# Altium footprint library RFID_RC632.PcbLib: 23 footprints (part 1 of 2)
Each footprint in its own frame and in the unit in brackets; x right, y up, seen from the top. Pads: shape width x height; smd on the part's side, far side on the other; paste and mask are expansions set on the pad; w line width, h text height; cw(c..) or ccw(c..) is an arc to the next point about the centre after c.
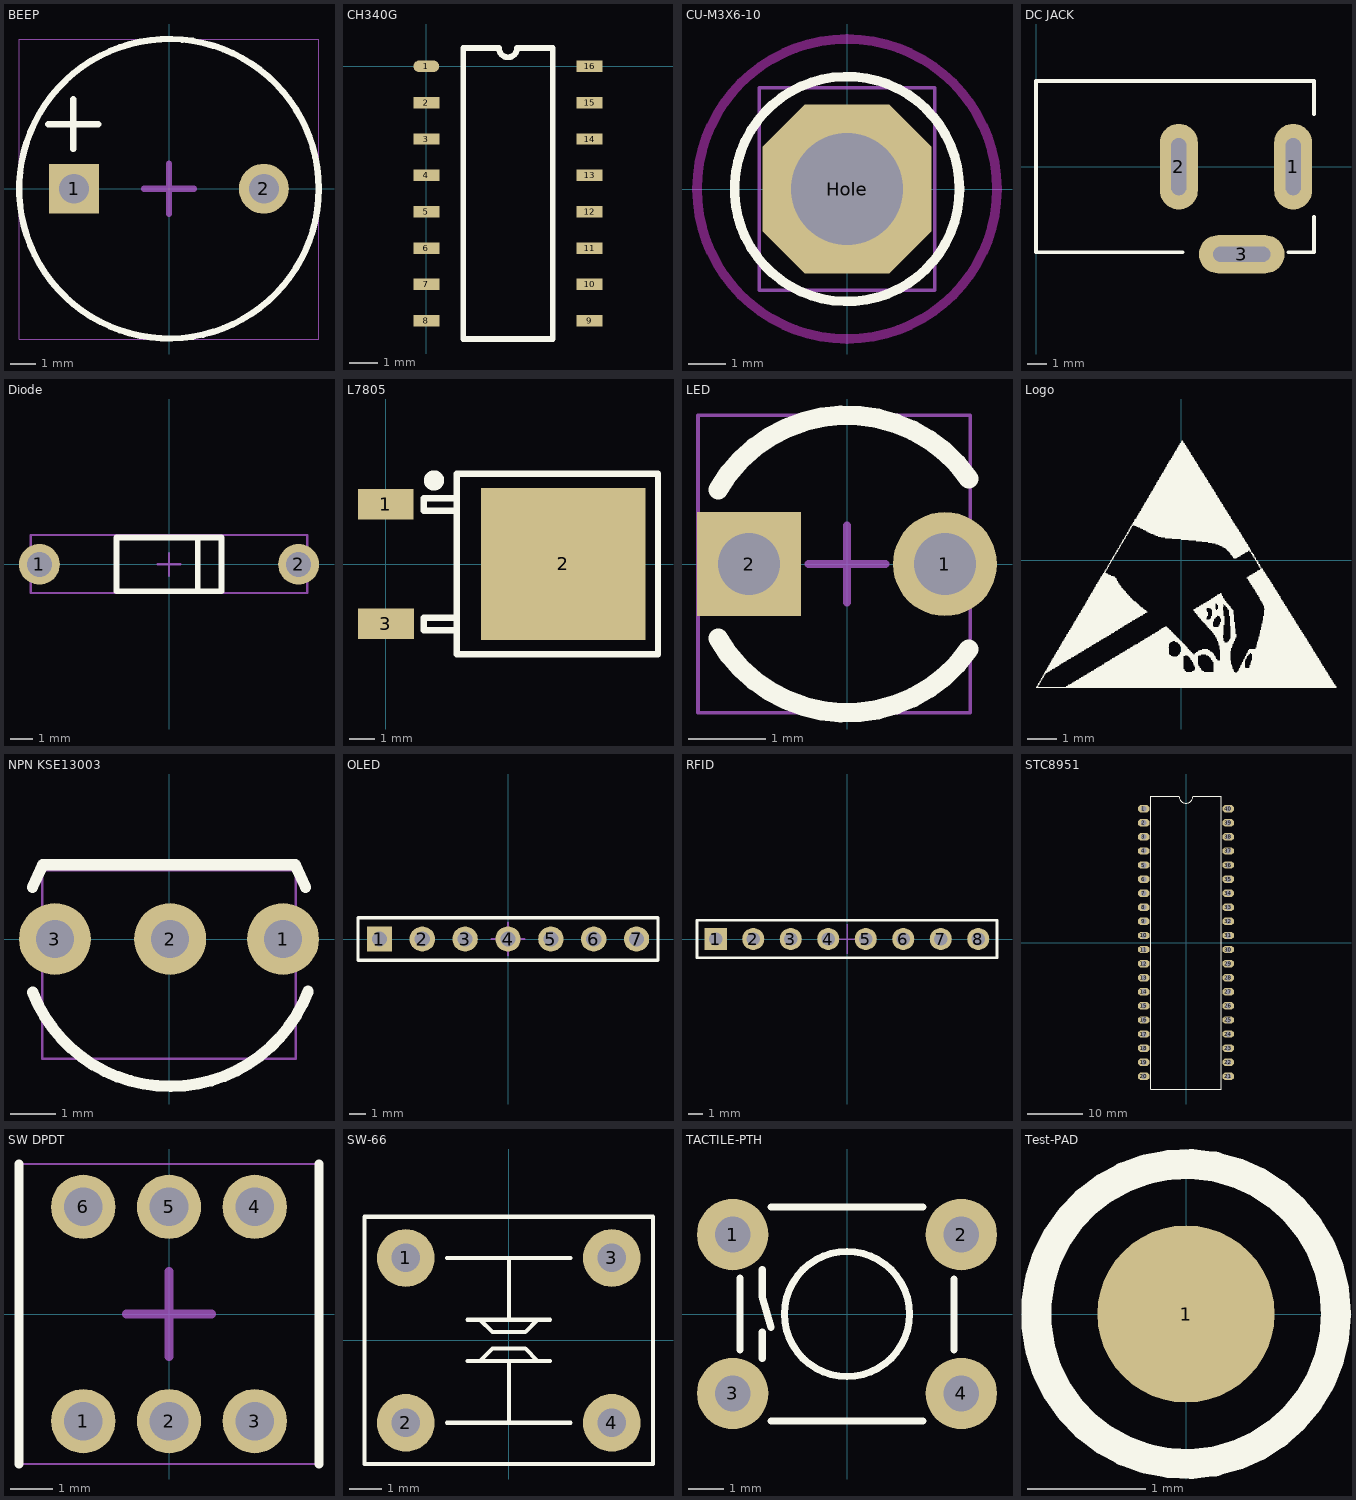
[diagram p0: the footprints below, top view; thin cyan lines are the x and y axes]

## BEEP [mm] "7.62脚距，12x9.5蜂鸣器"
height 9.5
pads (2):
  rect 2x2 hole 1.2: 1(-3.8,0)
  round 2 hole 1.2: 2(3.8,0)
Top Overlay:
  circle w0.254: c0,0 r6
  lines w0.254: -4.835,2.591 -2.835,2.591 ; -3.835,1.591 -3.835,3.591
Mechanical 13:
  lines w0.05: -6,-6.02 -6,5.98 6,5.98 6,-6.02 -6,-6.02
Mechanical 15:
  lines w0.254: -1,0 1,0 ; 0,-1 0,1
3D body "beep-d12000x9600.stp": height 9.8, standoff -4, extent -6,-6.02 6,5.98

## CH340G [mm] "USB to TTL Serial / UART"
pads (16):
  oval 0.9x0.4 smd: 1(0,0)
  rect 0.9x0.4 smd: 2(0,-1.27) 3(0,-2.54) 4(0,-3.81) 5(0,-5.08) 6(0,-6.35) 7(0,-7.62) 8(0,-8.89) 9(5.7,-8.89) 10(5.7,-7.62) 11(5.7,-6.35) 12(5.7,-5.08) 13(5.7,-3.81) 14(5.7,-2.54) 15(5.7,-1.27) 16(5.7,0)
Top Overlay:
  lines w0.2: 1.285,-9.525 4.415,-9.525 4.415,0.635 3.167,0.635 cw(c2.85,0.635) 2.532,0.635 1.285,0.635 1.285,-9.525
3D body "SOP-16.STEP": height 1.55, standoff -0.05, extent -0.282,-9.445 5.982,0.555

## CU-M3X6-10 [mm] "10mm长M3六角铜柱"
height 10
pads (1):
  oct 4.5x4.5 hole 3: Hole(0,0)
Top Overlay:
  circle w0.254: c0,0 r3
Keep-Out Layer:
  circle w0.254: c0,0 r4
Mechanical 1:
  circle w0.15: c0,0 r1.5
Mechanical 13:
  lines w0.1: -2.34,-2.702 -2.34,2.702 2.34,2.702 2.34,-2.702 -2.34,-2.702
Mechanical 15:
  lines w0.1: -1,0 1,0 ; 0,-1 0,1
3D body "cu_m3x6_10.stp": height 5.4, standoff -10.6, extent -2.34,-2.702 2.34,2.702

## DC JACK [mm] "DC Power Jack, 2.5mm, KLD Series, PCB Mount"
pads (3):
  oval 2x4.5 hole 0.8 slot 3 at 90 deg: 1(13.5,0) 2(7.5,0)
  oval 4.5x2 hole 0.8 slot 3 at 0 deg: 3(10.8,-4.6)
Top Overlay:
  lines w0.2: 7.696,-4.5 0,-4.5 0,4.5 14.6,4.5 14.6,2.769 ; 13.259,-4.5 14.6,-4.5 14.6,-2.642
3D body "dc-005.stp": height 11, standoff -3.9, extent 0,-4.725 14,4.725

## Diode [mm] "二极管封装（针式）"
height 2.8
pads (2):
  round 1.8 hole 1.1: 1(-5.715,0) 2(5.715,0)
Top Overlay:
  lines w0.254: 1.27,-1.188 1.27,1.188 ; -2.318,-1.188 -2.318,1.188 2.318,1.188 2.318,-1.188 -2.318,-1.188
Mechanical 13:
  lines w0.1: -6.096,-1.26 6.096,-1.26 6.096,1.29 -6.096,1.29 -6.096,-1.26
Mechanical 15:
  lines w0.1: -0.5,0 0,0 ; 0,-0.5 0,0 ; 0,0.5 0,0 ; 0.508,0 0,0
3D body "do-41.stp": height 2.78, standoff -2.47, extent -6.096,-1.26 6.096,1.29

## L7805 [mm] "180度编带包装"
pads (3):
  rect 2.2x1.2 smd: 1(0,2.361) 3(0.004,-2.361)
  rect 6.5x6 smd: 2(7,0)
Top Overlay:
  circle w0.4: c1.9,3.3 r0.2
  lines w0.254: 2.8,2.1 1.5,2.1 1.5,2.6 2.8,2.6 ; 2.804,-2.623 1.504,-2.623 1.504,-2.123 2.804,-2.123 ; 2.8,-3.573 2.8,3.573 10.75,3.573 10.75,-3.573 2.8,-3.573
3D body "TO-252.STEP": height 2.44, standoff 0.03, extent -0.2,-3.27 9.738,3.27

## LED [mm]
pads (2):
  round 1.35 hole 0.8: 1(1.27,0)
  rect 1.35x1.35 hole 0.8: 2(-1.27,0)
Top Overlay:
  lines w0.254: -1.671,-0.965 ccw(c0,0) 1.581,-1.107 ; -1.671,0.965 cw(c0,0) 1.581,1.107
Mechanical 13:
  lines w0.05: -1.93,-1.928 -1.93,1.928 1.598,1.928 1.598,-1.928 -1.93,-1.928
Mechanical 15:
  lines w0.1: -0.5,0 0.5,0 ; 0,-0.5 0,0.5
3D body "dipled3g-2.stp": height 5.4, standoff -3.44, extent -1.93,-1.928 1.598,1.928

## Logo [mil]
Top Overlay:
  drawing of 893 lines, arcs and shapes, not listed

## NPN KSE13003 [mm] "三极管"
height 10
pads (3):
  round 1.6 hole 0.85: 1(2.54,0) 2(0.025,0) 3(-2.54,0)
Top Overlay:
  lines w0.25: -3.04,1.153 -2.81,1.651 ; 2.81,1.651 3.04,1.153
  lines w0.254: -3.035,-1.187 ccw(c0.025,0) 3.096,-1.161 ; -2.81,1.651 2.81,1.651
Mechanical 11:
  lines w0.1: -0.5,0 0.5,0 ; 0,-0.5 0,0.5
Mechanical 13:
  lines w0.05: -2.82,-2.666 -2.82,1.524 2.82,1.524 2.82,-2.666 -2.82,-2.666
Mechanical 15:
  lines w0.1: -0.5,0 0.5,0 ; 0,-0.5 0,0.5
3D body "to92-cut-5.stp": height 9.43, standoff -3.9, extent -2.82,-2.666 2.82,1.524

## OLED [mm] "Connector; Header; 7 Position"
pads (7):
  rect 1.5x1.5 hole 0.9: 1(-7.62,0)
  round 1.5 hole 0.9: 2(-5.08,0) 3(-2.54,0) 4(0,0) 5(2.54,0) 6(5.08,0) 7(7.62,0)
Top Overlay:
  lines w0.2: -8.89,-1.27 8.89,-1.27 8.89,1.27 -8.89,1.27 -8.89,-1.27
Mechanical 13:
  lines w0.05: -8.89,-1.23 8.89,-1.23 8.89,1.27 -8.89,1.27 -8.89,-1.23
Mechanical 15:
  lines w0.1: -1,0 1,0 ; 0,-1 0,1
3D body "sip254p-7v.stp": height 10, standoff -2, extent -8.89,-1.23 8.89,1.27
3D body "User Library-128x64I2COLEDDisplayAdafruit.step": height 8.47, standoff -2.37, extent -13.35,-25.385 13.35,2.475
3D body: height 1.5, standoff -0.1, extent -1.778,2.794 -1.778,2.794

## RFID [mm] "Connector; Header; 8 Position"
pads (8):
  rect 1.5x1.5 hole 0.9: 1(-8.89,0)
  round 1.5 hole 0.9: 2(-6.35,0) 3(-3.81,0) 4(-1.27,0) 5(1.27,0) 6(3.81,0) 7(6.35,0) 8(8.89,0)
Top Overlay:
  lines w0.2: -10.16,-1.27 -10.16,1.27 10.16,1.27 10.16,-1.27 -10.16,-1.27
Mechanical 13:
  lines w0.05: -10.16,-1.23 -10.16,1.27 10.16,1.27 10.16,-1.23 -10.16,-1.23
Mechanical 15:
  lines w0.1: -1,0 1,0 ; 0,-1 0,1
3D body "sip254p-8v.stp": height 9.05, standoff -2.95, extent -10.16,-1.23 10.16,1.27

## STC8951 [mil]
pads (40):
  oct 80x52 hole 39.37: 1(-300,950) 2(-300,850) 3(-300,750) 4(-300,650) 5(-300,550) 6(-300,450) 7(-300,350) 8(-300,250) 9(-300,150) 10(-300,50) 11(-300,-50) 12(-300,-150) 13(-300,-250) 14(-300,-350) 15(-300,-450) 16(-300,-550) 17(-300,-650) 18(-300,-750) 19(-300,-850) 20(-300,-950) 21(300,-950) 22(300,-850) 23(300,-750) 24(300,-650) 25(300,-550) 26(300,-450) 27(300,-350) 28(300,-250) 29(300,-150) 30(300,-50) 31(300,50) 32(300,150) 33(300,250) 34(300,350) 35(300,450) 36(300,550) 37(300,650) 38(300,750) 39(300,850) 40(300,950)
Top Overlay:
  lines w6: -250,-1040 250,-1040 250,1040 50,1040 cw(c0,1040) -50,1040 -250,1040 -250,-1040
3D body "ZIF-40.STEP": height 146.85, standoff -483.07, extent -489.8,-1194.51 449.8,1844.51
3D body "89C51-DIP40.step": height 696.46, standoff 374.8, extent -305.11,-1035.43 305.12,1035.43

## SW DPDT [mm] "自锁开关"
height 13.5
pads (6):
  round 1.5 hole 0.9: 1(-2,-2.5) 2(0,-2.5) 3(2,-2.5) 4(2,2.5) 5(0,2.5) 6(-2,2.5)
Top Overlay:
  lines w0.2: -3.5,-3.5 -3.5,3.5 ; 3.5,-3.5 3.5,3.5
Mechanical 13:
  lines w0.05: -3.5,-3.5 -3.5,3.5 3.5,3.5 3.5,-3.5 -3.5,-3.5
Mechanical 15:
  lines w0.2: -1,0 1,0 ; 0,-1 0,1
3D body "ps-22e07.stp": height 12.6, standoff -3.5, extent -3.5,-3.5 3.5,3.5

## SW-66 [mil] "6×6轻触开关"
pads (4):
  round 70 hole 34.65: 1(-125,100) 2(-125,-100) 3(125,100) 4(125,-100)
Top Overlay:
  lines w5: -75,-100 75,-100 ; -75,100 75,100 ; -50,-25 50,-25 ; -50,25 50,25 ; -35,-25 -20,-10 20,-10 35,-25 ; -35,25 -20,10 20,10 35,25 ; 0,-100 0,-25 ; 0,25 0,100 ; -175,-150 -175,150 175,150 175,-150 -175,-150
3D body "User Library-Panasonic-EVQPA-Pushbutton.STEP": height 212.6, standoff -118.11, extent -161.65,-118.1 161.65,118.11

## TACTILE-PTH [mil] "直插按钮"
pads (4):
  round 80 hole 40: 1(-128,89) 2(128,89) 3(-128,-89) 4(128,-89)
Top Overlay:
  circle w8: c0,0 r70
  lines w8: -120,-40 -120,40.47 ; -95,-50 -95,-20 ; -95,50 -95,20 -85,-15 ; -85,-120 85,-120 ; -85,120 85,120 ; 120,-40 120,39.29
3D body "User Library-Panasonic-EVQPA-Pushbutton.STEP": height 212.6, standoff -118.11, extent -161.65,-118.11 161.64,118.11

## Test-PAD [mm] "测试焊盘"
pads (1):
  round 1.5 smd: 1(0,0)
Top Overlay:
  circle w0.254: c0,0 r1.27